# Altium schematic symbol library AD_Lib.SchLib: 1239 symbols (part 5 of 9) (continued)
## J_09 03 264 6825
designator J?, comment 09 03 264 6825
Harting,Female,2*32; Quality: -50~125¡æ; Value: Female,64P; pro-environment: RoHS; SN: 03.4.31.35.11682501S; other: ¹þ¶¡±³°åÁ¬½ÓÆ÷£¬±³°åÓÃ; PadsNum: 0; Manufacturer: Harting; Category: Á¬½ÓÆ÷; OPN: 09 03 264 6825; Part: 09 03 264 6825; QTY: 100; Price: 19.7262; OPN_JLC: OPN_JLC; SN_JLC: SN_JLC; Price_JLC: 0
footprint 09 03 264 6825 (Connector; DIN 41612, Type R, Thru-Hole; Rows a+c, 64 Position; Vertical)
part A pins: a1, a2, a3, a4, a5, a6, a7, a8, a9, a10, a11, a12, a13, a14, a15, a16, a17, a18, a19, a20, a21, a22, a23, a24, a25, a26, a27, a28, a29, a30, a31, a32
part B pins: c1, c2, c3, c4, c5, c6, c7, c8, c9, c10, c11, c12, c13, c14, c15, c16, c17, c18, c19, c20, c21, c22, c23, c24, c25, c26, c27, c28, c29, c30, c31, c32
part C pins: 33 MH1 "Mounting Fixture", 34 MH2 "Mounting Fixture"
part C text: Ä¸; Í·

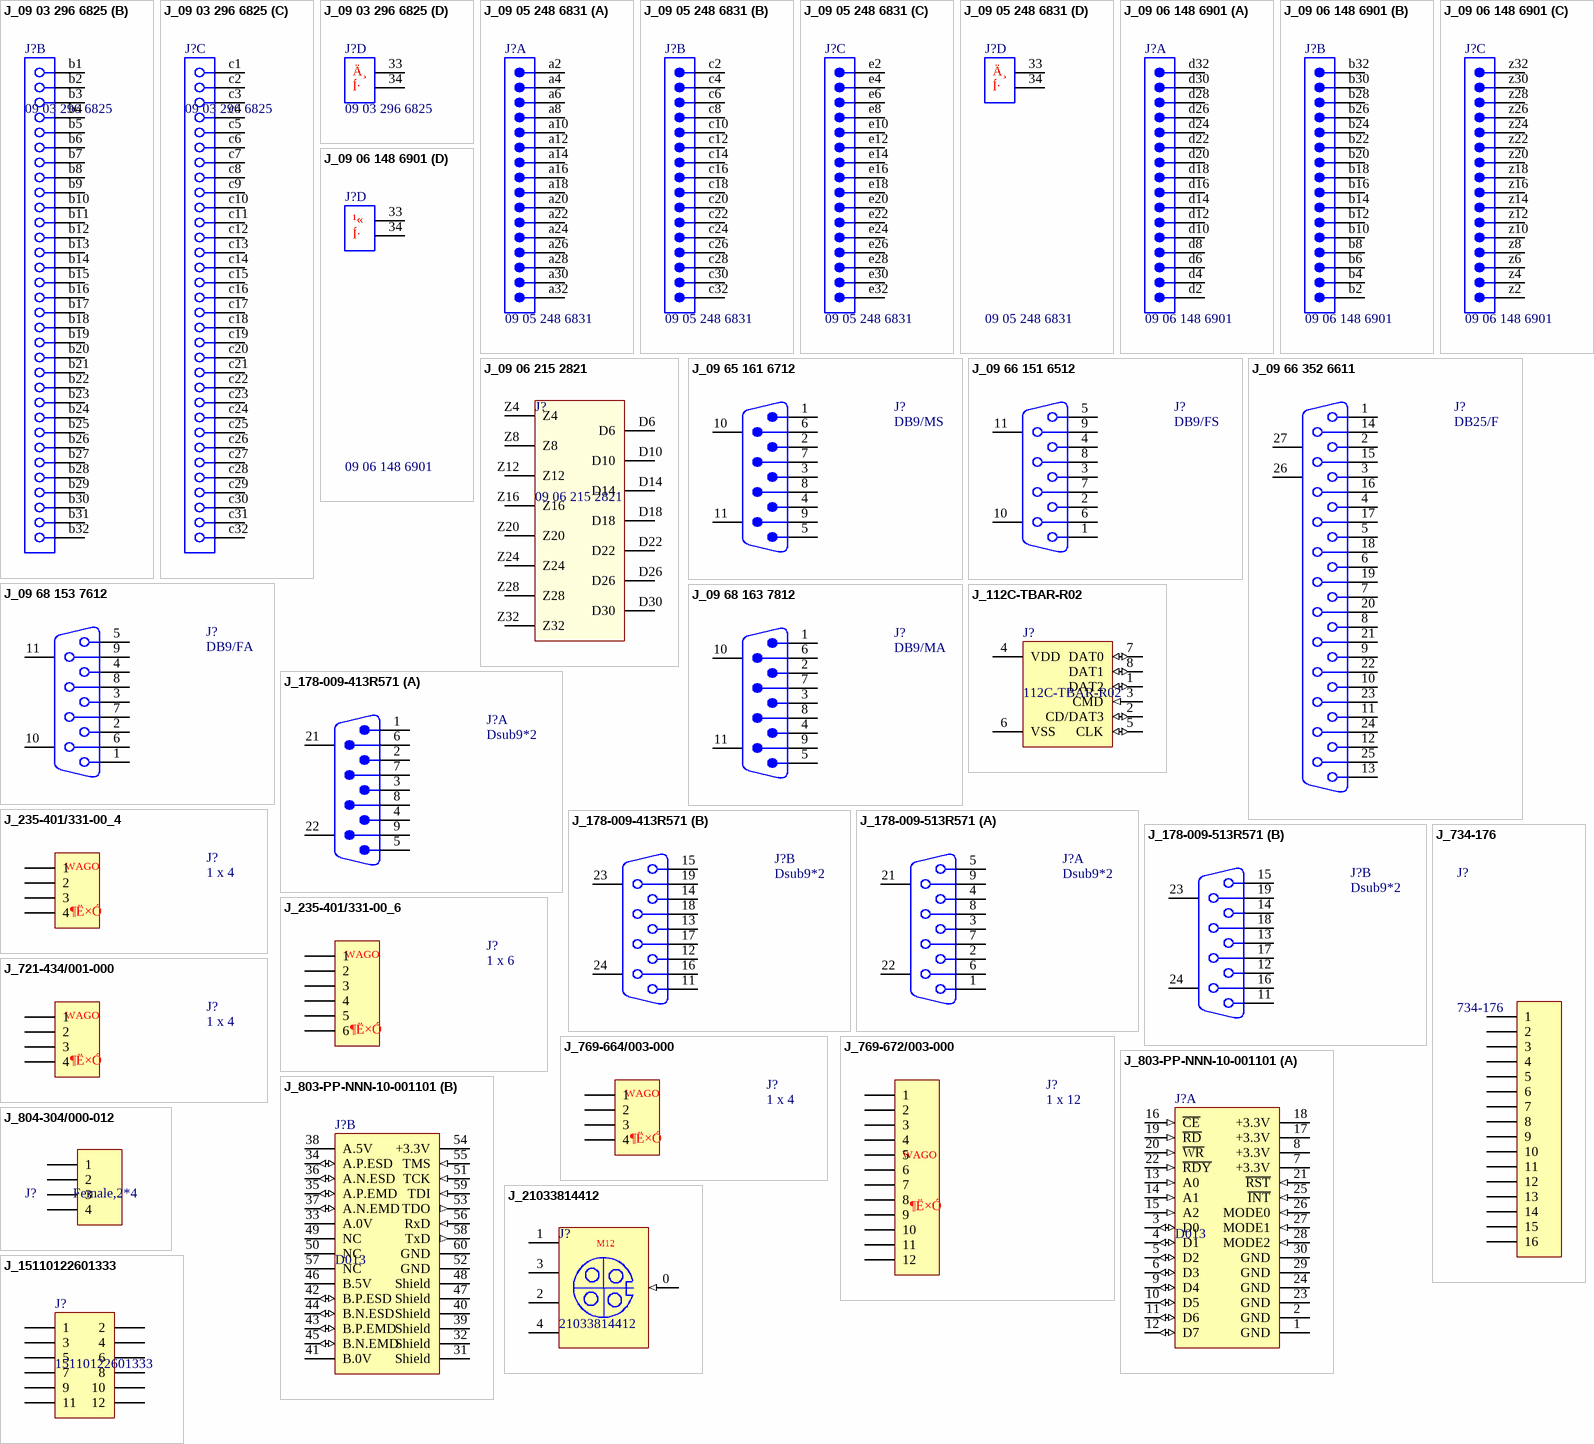
[diagram p22: symbols J_09 03 296 6825 to J_15110122601333]

## J_09 03 296 6825
designator J?, comment 09 03 296 6825
Harting,Female,3*32; Quality: -50~125¡æ; Value: Female,96P; pro-environment: RoHS; SN: 03.4.31.35.99682501S; other: ¹þ¶¡±³°åÁ¬½ÓÆ÷; PadsNum: 0; Manufacturer: Harting; Category: Á¬½ÓÆ÷; OPN: 09 03 296 6825; Part: 09 03 296 6825; QTY: 100; Price: 22.9554; OPN_JLC: OPN_JLC; SN_JLC: SN_JLC; Price_JLC: 0
footprint 09 03 296 6825 (Connector; DIN 41612, Type R, Thru-Hole; Rows a+c, 96 Position; Vertical)
part A pins: a1, a2, a3, a4, a5, a6, a7, a8, a9, a10, a11, a12, a13, a14, a15, a16, a17, a18, a19, a20, a21, a22, a23, a24, a25, a26, a27, a28, a29, a30, a31, a32
part B pins: b1, b2, b3, b4, b5, b6, b7, b8, b9, b10, b11, b12, b13, b14, b15, b16, b17, b18, b19, b20, b21, b22, b23, b24, b25, b26, b27, b28, b29, b30, b31, b32
part C pins: c1, c2, c3, c4, c5, c6, c7, c8, c9, c10, c11, c12, c13, c14, c15, c16, c17, c18, c19, c20, c21, c22, c23, c24, c25, c26, c27, c28, c29, c30, c31, c32
part D pins: 33 MH1 "Mounting Fixture", 34 MH2 "Mounting Fixture"
part D text: Ä¸; Í·

## J_09 05 248 6831
designator J?, comment 09 05 248 6831
Harting; Female; 3*16; other: ¹þ¶¡¶ÔÍâÁ¬½ÓÆ÷£¬µ¥°åÓÃ; Quality: -50~125¡æ; pro-environment: RoHS; Value: Male,48P; PadsNum: 0; Manufacturer: Harting; SN: SN; Category: ½Ó²å¼þ/Á¬½ÓÆ÷; OPN: 09 05 248 6831; Part: 09 05 248 6831; QTY: 20; Price: 75.4049; OPN_JLC: OPN_JLC; SN_JLC: SN_JLC; Price_JLC: 0
footprint J_09 05 248 6831 (¹þ¶¡±³°å½ÓÍ·£¬¹«Ä¸Í·£¬48P)
part A pins: a2, a4, a6, a8, a10, a12, a14, a16, a18, a20, a22, a24, a26, a28, a30, a32
part B pins: c2, c4, c6, c8, c10, c12, c14, c16, c18, c20, c22, c24, c26, c28, c30, c32
part C pins: e2, e4, e6, e8, e10, e12, e14, e16, e18, e20, e22, e24, e26, e28, e30, e32
part D pins: 33 MH1 "Mounting Fixture", 34 MH2 "Mounting Fixture"
part D text: Ä¸; Í·

## J_09 06 148 6901
designator J?, comment 09 06 148 6901
Harting,Male,3*16; other: ¹þ¶¡¶ÔÍâÁ¬½ÓÆ÷£¬µ¥°åÓÃ; Quality: -50~125¡æ; pro-environment: RoHS; SN: 03.4.31.35.99690101S; Value: Male,48P; PadsNum: 0; Manufacturer: Harting; Category: ½Ó²å¼þ/Á¬½ÓÆ÷; OPN: 09 06 148 6901; Part: 09 06 148 6901; QTY: 20; Price: 46.7415; OPN_JLC: OPN_JLC; SN_JLC: SN_JLC; Price_JLC: 0
footprint 09 06 148 6901 (¹þ¶¡¶ÔÍâ½ÓÍ·£¨DBZ£©)
part A pins: d2, d4, d6, d8, d10, d12, d14, d16, d18, d20, d22, d24, d26, d28, d30, d32
part B pins: b2, b4, b6, b8, b10, b12, b14, b16, b18, b20, b22, b24, b26, b28, b30, b32
part C pins: z2, z4, z6, z8, z10, z12, z14, z16, z18, z20, z22, z24, z26, z28, z30, z32
part D pins: 33 MH1 "Mounting Fixture", 34 MH2 "Mounting Fixture"
part D text: ¹«; Í·

## J_09 06 215 2821
designator J?, comment 09 06 215 2821
Harting,Female,7+8; SN: 03.4.31.35.99282101S; Value: 7+8,Female; pro-environment: RoHS; Quality: -55~80¡æ; PadsNum: 0; Category: Á¬½ÓÆ÷; OPN: 09 06 215 2821; Part: 09 06 215 2821; Manufacturer: Harting; QTY: 20; Price: 77.5359; OPN_JLC: OPN_JLC; SN_JLC: SN_JLC; Price_JLC: 0
footprint 09 06 215 2821
pins: D6, D10, D14, D18, D22, D26, D30, Z4, Z8, Z12, Z16, Z20, Z24, Z28, Z32

## J_09 65 161 6712
designator J?, comment DB9/MS
DSub9; Male; Straight; Manufacturer: Harting; Value: DSub9,Male; pro-environment: RoHS; OPN: 09 65 161 6712; Quality: -55~125¡ãC; PadsNum: 0; SN: SN; Category: Á¬½ÓÆ÷; Part: DB9/MS; QTY: 50; Price: 15.561; OPN_JLC: OPN_JLC; SN_JLC: SN_JLC; Price_JLC: 0
footprint J_DB9_MS (Dsub9£¬¹«Í·£¬Ö±Õë)
pins: 1, 2, 3, 4, 5, 6, 7, 8, 9, 10 MH1, 11 MH2

## J_09 66 151 6512
designator J?, comment DB9/FS
DSub9; Female; Straight; Manufacturer: Harting; Value: DSub9,Female; pro-environment: RoHS; OPN: 09 66 151 6512; Quality: -55~125¡ãC; other: ÂÝÖù UNC 09670019941; PadsNum: 0; SN: SN; Category: Á¬½ÓÆ÷; Part: DB9/FS; QTY: 50; Price: 19.7145; OPN_JLC: OPN_JLC; SN_JLC: SN_JLC; Price_JLC: 0
footprint DB9_FS (Dsub9£¬Ä¸Í·£¬Ö±Õë)
pins: 1, 2, 3, 4, 5, 6, 7, 8, 9, 10 MH1, 11 MH2

## J_09 66 352 6611
designator J?, comment DB25/F
DSub25,Female,Straight; Manufacturer: Harting; pro-environment: RoHS; OPN: 09 66 352 6611; Quality: -55~125¡ãC; other: ÂÝÖù UNC 09670019941; PadsNum: 0; Value: DSub25,Female; SN: SN; Category: Á¬½ÓÆ÷; Part: DB25/F; QTY: 100; Price: 48.7188; OPN_JLC: OPN_JLC; SN_JLC: SN_JLC; Price_JLC: 0
footprint DB25_FS (Footprint not found)
pins: 1, 2, 3, 4, 5, 6, 7, 8, 9, 10, 11, 12, 13, 14, 15, 16, 17, 18, 19, 20, 21, 22, 23, 24, 25, 26 MH1, 27 MH2

## J_09 68 153 7612
designator J?, comment DB9/FA
DSub9; Female; Angle; Manufacturer: Harting; Value: DSub9,Female; pro-environment: RoHS; SN: 03.4.31.99.99153701S; OPN: 09 68 153 7612; Quality: -55~125¡ãC; other: ÂÝÖù UNC 09670019941; PadsNum: 0; Category: Á¬½ÓÆ÷; Part: DB9/FA; QTY: 50; Price: 19.7145; OPN_JLC: OPN_JLC; SN_JLC: SN_JLC; Price_JLC: 0
footprint J_DB9_FA (Connector; D Subminiature; 9 Position; Right Angle; Pitch 1.385 mm)
pins: 1, 2, 3, 4, 5, 6, 7, 8, 9, 10 MH1, 11 MH2

## J_09 68 163 7812
designator J?, comment DB9/MA
DSub9; Male; Angle; Manufacturer: Harting; Value: DSub9,Male; pro-environment: RoHS; SN: 03.4.31.99.99163701S; OPN: 09 68 163 7812; Quality: -55~125¡ãC; other: ÂÝÖù UNC 09670019941; PadsNum: 0; Category: Á¬½ÓÆ÷; Part: DB9/MA; QTY: 50; Price: 15.561; OPN_JLC: OPN_JLC; SN_JLC: SN_JLC; Price_JLC: 0
footprint J_DB9_MA (Connector; D Subminiature; 9 Position; Right Angle; Pitch 1.385 mm)
pins: 1, 2, 3, 4, 5, 6, 7, 8, 9, 10 MH1, 11 MH2

## J_112C-TBAR-R02
designator J?, comment 112C-TBAR-R02
MicroSD¿¨²Û; 1*8; 1.1mm; Manufacturer: Attend; Quality: -50~125¡æ; Value: Female,8P; pro-environment: RoHS; other: SD¿¨²Û; PadsNum: 12; SN: SN; Category: Á¬½ÓÆ÷; OPN: 112C-TBAR-R02; Part: 112C-TBAR-R02; QTY: 1000; Price: -; OPN_JLC: DS1139-06-08SS4BSR; SN_JLC: C86574; Price_JLC: 1.0732
footprint J_MicroSD
pins: 1 DAT2 (io), 2 CD/DAT3 (io), 3 CMD (in), 4 VDD (power), 5 CLK (io), 6 VSS (power), 7 DAT0 (io), 8 DAT1 (io)

## J_178-009-413R571
designator J?, comment Dsub9*2
DSub9 * 2; ¹«/Ä¸Í·; ÍäÕë; Manufacturer: NorComp; pro-environment: RoHS; OPN: 178-009-413R571; Quality: -55~125¡ãC; other: ÂÝÖù£¿£¿£¿; PadsNum: 0; Value: DSub9 * 2; SN: SN; Category: Á¬½ÓÆ÷; Part: Dsub9*2; QTY: 45; Price: 48.3188; OPN_JLC: OPN_JLC; SN_JLC: SN_JLC; Price_JLC: 0
footprint J_178-009-413R571 (Dual Port D-SUB plug)
part A pins: 1, 2, 3, 4, 5, 6, 7, 8, 9, 21 MH1, 22 MH2
part B pins: 11, 12, 13, 14, 15, 16, 17, 18, 19, 23 FH, 24 FH2

## J_178-009-513R571
designator J?, comment Dsub9*2
DSub9 * 2; Ä¸/Ä¸Í·; ÍäÕë; Manufacturer: NorComp; pro-environment: RoHS; OPN: 178-009-513R571; Quality: -55~125¡ãC; other: ÂÝÖù£¿£¿£¿; PadsNum: 0; Value: DSub9 * 2; SN: SN; Category: Á¬½ÓÆ÷; Part: Dsub9*2; QTY: 45; Price: 48.3188; OPN_JLC: OPN_JLC; SN_JLC: SN_JLC; Price_JLC: 0
footprint J_178-009-513R571 (Dual Port D-SUB plug upper -socket bottom)
part A pins: 1, 2, 3, 4, 5, 6, 7, 8, 9, 21 MH1, 22 MH2
part B pins: 11, 12, 13, 14, 15, 16, 17, 18, 19, 23 FH, 24 FH2

## J_235-401/331-00_4
designator J?, comment 1 x 4
WAGO½ÓÏß¶Ë×Ó;1*4;10A;300V; Manufacturer: WAGO; pro-environment: RoHS; OPN: 235-401/331-00; Quality: -55~125¡ãC; other: 4¼«;»ÒÉ«; PadsNum: 0; Value: 10A;300V; SN: SN; Category: Á¬½ÓÆ÷; Part: 1 x 4; QTY: 800; Price: ?; OPN_JLC: OPN_JLC; SN_JLC: SN_JLC; Price_JLC: 0
footprint 235-401/331-00_4
pins: 1, 2, 3, 4
text: ¶Ë×Ó

## J_235-401/331-00_6
designator J?, comment 1 x 6
WAGO½ÓÏß¶Ë×Ó£¬1*6; Manufacturer: WAGO; Value: 10A;300V; pro-environment: RoHS; OPN: 235-401/331-00; Quality: -55~125¡ãC; other: 6¼«;»ÒÉ«; PadsNum: 0; SN: SN; Category: Á¬½ÓÆ÷; Part: 1 x 6; QTY: 800; Price: ?; OPN_JLC: OPN_JLC; SN_JLC: SN_JLC; Price_JLC: 0
footprint 235-401/331-00_6 (WAGOÖ®PCB½ÓÏß¶Ë×Ó£¬Æ´½ÓÊ½£¬6¼«)
pins: 1, 2, 3, 4, 5, 6
text: ¶Ë×Ó

## J_721-434/001-000
designator J?, comment 1 x 4
WAGO½ÓÏß¶Ë×Ó;1*4;10A;300V; Manufacturer: WAGO; pro-environment: RoHS; SN: 03.4.31.17.99434001S; OPN: 721-434/001-000; Quality: -55~125¡ãC; other: 4¼«;°×É«; PadsNum: 0; Value: 10A;300V; Category: Á¬½ÓÆ÷; Part: 1 x 4; QTY: 200; Price: ?; OPN_JLC: OPN_JLC; SN_JLC: SN_JLC; Price_JLC: 0
footprint 721-434/001-000_4 (Footprint not found)
pins: 1, 2, 3, 4
text: ¶Ë×Ó

## J_734-176
designator J?, comment 734-176
WAGO¶Ë×Ó;1*16; Manufacturer: WAGO; Part: HDR1*16; other: Òý½Å¼ä¾à2.54mm; Quality: -55~105¡ãC; pro-environment: RoHS; PadsNum: 0; SN: SN; Value: 1*16; Category: Á¬½ÓÆ÷; OPN: 734-176; Price: ?; OPN_JLC: OPN_JLC; SN_JLC: SN_JLC; Price_JLC: 0
footprint 734-176 (Footprint not found)
pins: 1, 2, 3, 4, 5, 6, 7, 8, 9, 10, 11, 12, 13, 14, 15, 16

## J_769-664/003-000
designator J?, comment 1 x 4
WAGO½ÓÏß¶Ë×Ó;1*4;32A;500V; Manufacturer: WAGO; pro-environment: RoHS; OPN: 769-664/003-000; Quality: -55~125¡ãC; other: 4¼«;»ÒÉ«; PadsNum: 0; Value: 32A;500V; SN: SN; Category: Á¬½ÓÆ÷; Part: 1 x 4; QTY: 800; Price: ?; OPN_JLC: OPN_JLC; SN_JLC: SN_JLC; Price_JLC: 0
footprint 769-664/003-000_4 (Footprint not found)
pins: 1, 2, 3, 4
text: ¶Ë×Ó

## J_769-672/003-000
designator J?, comment 1 x 12
WAGO½ÓÏß¶Ë×Ó;1*12;32A;250V; Manufacturer: WAGO; pro-environment: RoHS; OPN: 769-672/003-000; Quality: -55~125¡ãC; other: 12¼«;»ÒÉ«; PadsNum: 0; Value: 32A;250V; SN: SN; Category: Á¬½ÓÆ÷; Part: 1 x 12; QTY: 25; Price: ?; OPN_JLC: OPN_JLC; SN_JLC: SN_JLC; Price_JLC: 0
footprint 769-672/003-000 (Footprint not found)
pins: 1, 2, 3, 4, 5, 6, 7, 8, 9, 10, 11, 12
text: ¶Ë×Ó

## J_803-PP-NNN-10-001101
designator J?, comment D013
MVBÄ£¿é²å×ù; Manufacturer: TRACO; Quality: -40~85¡æ; Value: Female,60Pin; pro-environment: RoHS; other: MVBÄ£¿éD013²å×ù£¬2¸ö2*15Ë«ÅÅÄ¸; OPN: 803-PP-NNN-10-001101; PadsNum: 0; SN: SN; Category: Á¬½ÓÆ÷; Part: D013; QTY: 1; Price: ?; OPN_JLC: OPN_JLC; SN_JLC: SN_JLC; Price_JLC: 0
footprint D013 (MVB²å×ù£¬803-PP-NNN-10-001101)
part A pins: 1 GND (power), 2 GND (power), 3 D0 (io), 4 D1 (io), 5 D2 (io), 6 D3 (io), 7 +3.3V (power), 8 +3.3V (power), 9 D4 (io), 10 D5 (io), 11 D6 (io), 12 D7 (io), 13 A0 (in), 14 A1 (in), 15 A2 (in), 16 ~{CE} (in), 17 +3.3V (power), 18 +3.3V (power), 19 ~{RD} (in), 20 ~{WR} (in), 21 ~{RST} (in), 22 ~{RDY} (in), 23 GND (power), 24 GND (power), 25 ~{INT} (in), 26 MODE0 (in), 27 MODE1 (in), 28 MODE2 (in), 29 GND (power), 30 GND (power)
part B pins: 31 Shield (power), 32 Shield (power), 33 A.0V (power), 34 A.P.ESD (io), 35 A.P.EMD (io), 36 A.N.ESD (io), 37 A.N.EMD (io), 38 A.5V (power), 39 Shield (power), 40 Shield (power), 41 B.0V (power), 42 B.P.ESD (io), 43 B.P.EMD (io), 44 B.N.ESD (io), 45 B.N.EMD (io), 46 B.5V (power), 47 Shield (power), 48 Shield (power), 49 NC (power), 50 NC (power), 51 TCK (in), 52 GND (power), 53 TDO (out), 54 +3.3V (power), 55 TMS (in), 56 RxD (in), 57 NC (power), 58 TxD (out), 59 TDI (in), 60 GND (power)

## J_804-304/000-012
designator J?, comment Female,2*4
Á¬½ÓÆ÷£¬Ä¸Í·£¬2*4; manufacturer: WAGO; Quality: -40~85¡æ; OPN: 804-304/000-012; Pro-environment: RoHS; PadsNum: 0; Value: Female,2*4; Category: Á¬½ÓÆ÷; SN: SN; Price: ?; OPN_JLC: OPN_JLC; SN_JLC: SN_JLC; Price_JLC: 0
footprint 804-304/000-012
pins: 1, 2, 3, 4

## J_21033814412
designator J?, comment 21033814412
M12Á¬½ÓÆ÷; Manufacturer: Harting; SN: 03.4.31.18.99441201S; pro-environment: RoHS; Quality: -55~80¡æ; PadsNum: 0; Category: Á¬½ÓÆ÷; OPN: 21033814412; Part: 21033814412; Value: -; QTY: 10; Price: ?; OPN_JLC: OPN_JLC; SN_JLC: SN_JLC; Price_JLC: 0
footprint 21033814412 (M12Á¬½ÓÆ÷)
pins: 0 Sheld (in), 1, 2, 3, 4
text: M12

## J_15110122601333
designator J?, comment 15110122601333
Harting,Male,2*6; Quality: -50~125¡æ; Value: Male,12P; pro-environment: RoHS; SN: 03.4.31.35.99151101S; other: °å¶Ô°åÓë¼Ð²ãÁ¬½ÓÆ÷; PadsNum: 0; Manufacturer: Harting; Category: Á¬½ÓÆ÷; OPN: 15110122601333; Part: 15110122601333; QTY: 2; Price: ?; OPN_JLC: OPN_JLC; SN_JLC: SN_JLC; Price_JLC: 0
footprint 15110122601 (Har_flex_M/F_straight_12Pin)
pins: 1, 2, 3, 4, 5, 6, 7, 8, 9, 10, 11, 12

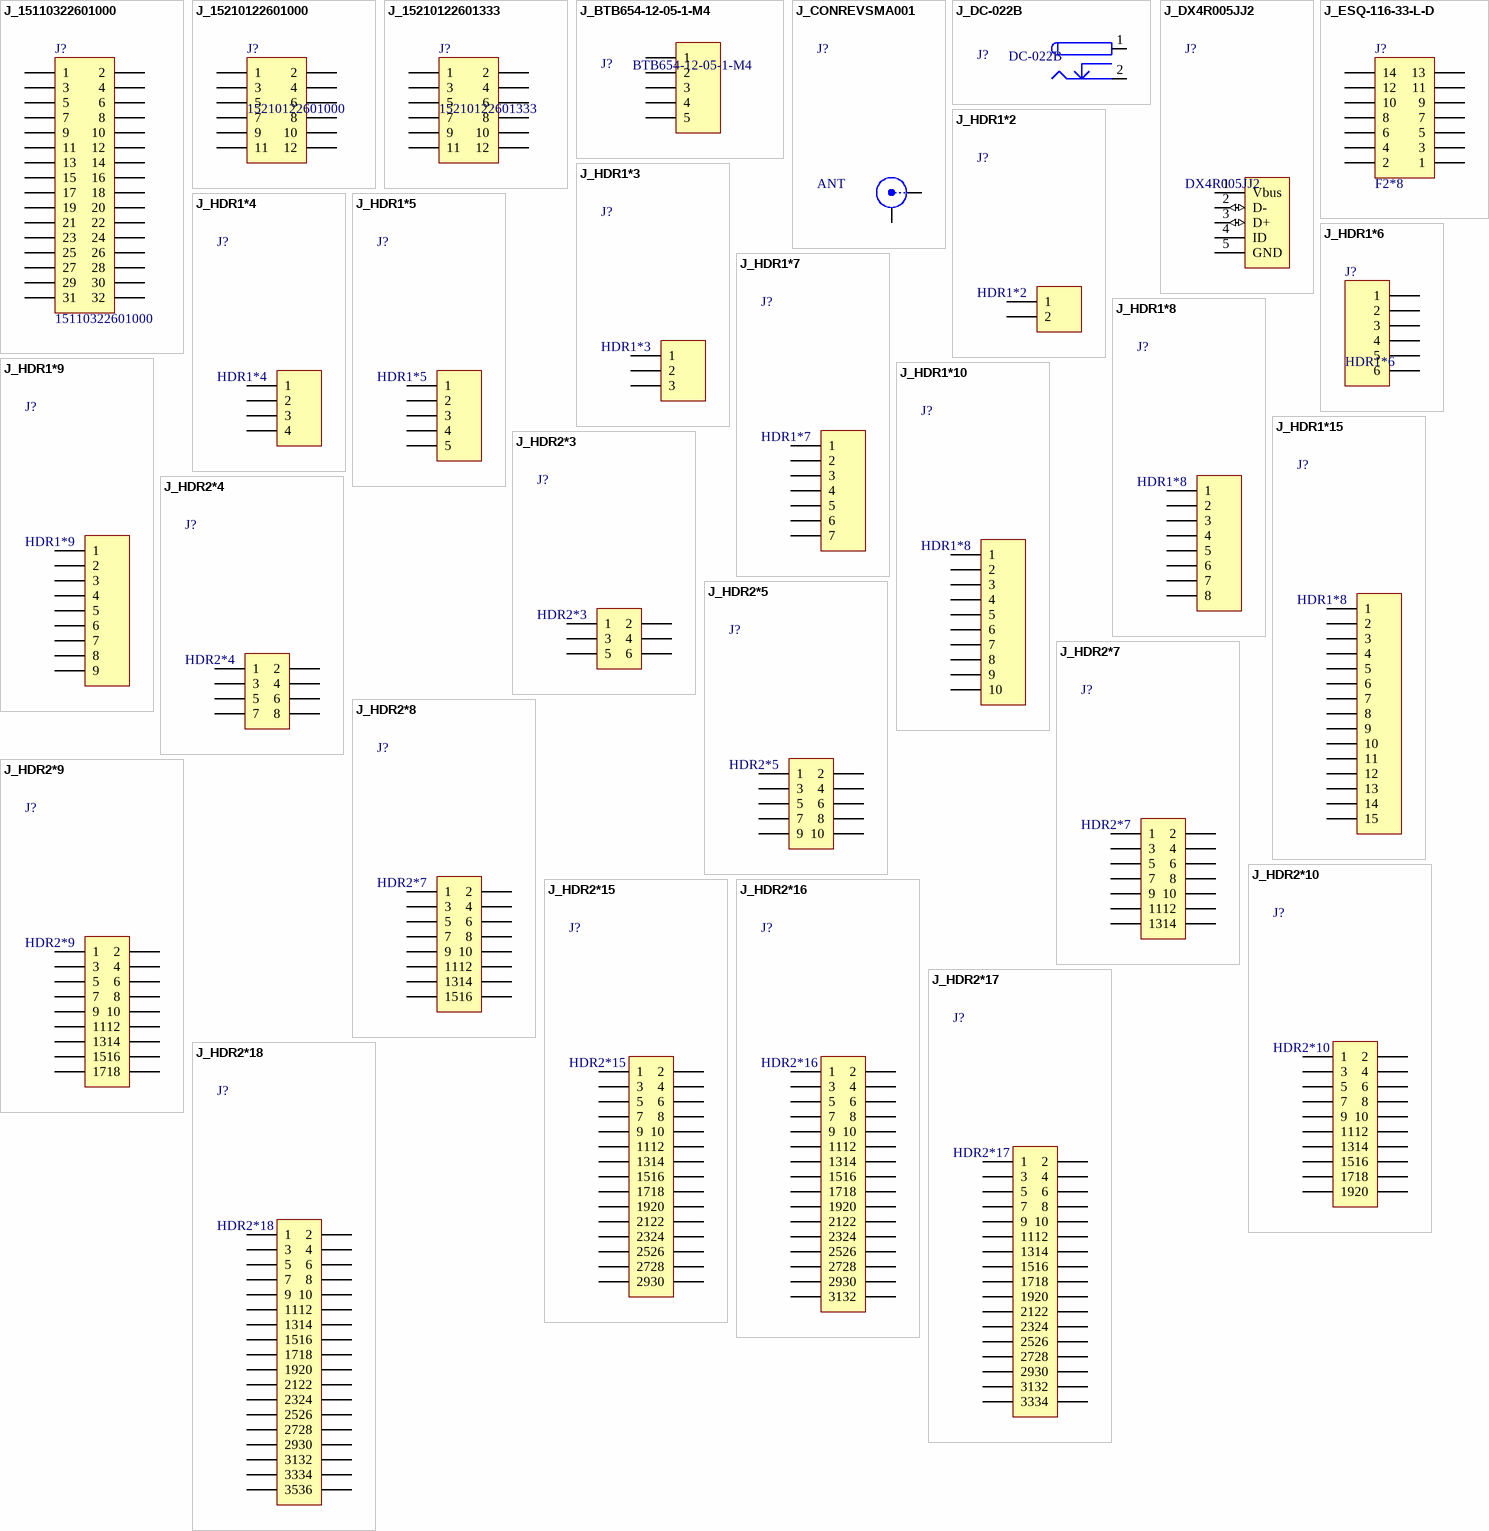
[diagram p23: symbols J_15110322601000 to J_HDR2*18]

## J_15110322601000
designator J?, comment 15110322601000
Harting,Male,2*16; pro-environment: RoHS; Quality: -55~80¡æ; SN: 03.4.31.13.99151101S; Value: Male;16*2; PadsNum: 0; Manufacturer: Harting; Category: Á¬½ÓÆ÷; OPN: 15110322601000; Part: 15110322601000; QTY: 280; Price: 27.1089; OPN_JLC: OPN_JLC; SN_JLC: SN_JLC; Price_JLC: 0
footprint 15110322601000 (Male)
pins: 1, 2, 3, 4, 5, 6, 7, 8, 9, 10, 11, 12, 13, 14, 15, 16, 17, 18, 19, 20, 21, 22, 23, 24, 25, 26, 27, 28, 29, 30, 31, 32

## J_15210122601000
designator J?, comment 15210122601000
Harting,Male,2*6; Quality: -50~125¡æ; Value: Male,12P; pro-environment: RoHS; SN: 03.4.31.35.99151101S; other: °å¶Ô°åÓë¼Ð²ãÁ¬½ÓÆ÷; PadsNum: 0; Manufacturer: Harting; Category: Á¬½ÓÆ÷; OPN: 15210122601000; Part: 15210122601000; QTY: 280; Price: 18.3573; OPN_JLC: OPN_JLC; SN_JLC: SN_JLC; Price_JLC: 0
footprint 15210122601 (Har_flex_M/F_straight_12Pin)
pins: 1, 2, 3, 4, 5, 6, 7, 8, 9, 10, 11, 12

## J_15210122601333
designator J?, comment 15210122601333
Harting,Female,2*6; Quality: -50~125¡æ; Value: Female,12P; pro-environment: RoHS; SN: 03.4.31.35.99152101S; other: °å¶Ô°åÓë¼Ð²ãÁ¬½ÓÆ÷; PadsNum: 0; Manufacturer: Harting; Category: Á¬½ÓÆ÷; OPN: 15210122601333; Part: 15210122601333; QTY: 2; Price: ?; OPN_JLC: OPN_JLC; SN_JLC: SN_JLC; Price_JLC: 0
footprint 15210122601 (Har_flex_M/F_straight_12Pin)
pins: 1, 2, 3, 4, 5, 6, 7, 8, 9, 10, 11, 12

## J_BTB654-12-05-1-M4
designator J?, comment BTB654-12-05-1-M4
½ÓÏß¶Ë×Ó£¬1*5; manufacturer: ½ÜÌØ; SN: 03.4.31.16.99BTB601S; Pro-environment: RoHS; PadsNum: 0; Category: Á¬½ÓÆ÷; OPN: BTB654-12-05-1-M4; Price: ?; OPN_JLC: OPN_JLC; SN_JLC: SN_JLC; Price_JLC: 0
footprint BTB654-12-05-1-M4
pins: 1, 2, 3, 4, 5

## J_CONREVSMA001
designator J?, comment ANT
SMA; Female; SMAKE Õý½ÅÁ¢Ê½; Manufacturer: Linx; Quality: -55~105¡ãC; pro-environment: RoHS; Value: ANT, Female; OPN: CONREVSMA001; PadsNum: 0; other: SMA; SN: SN; Category: Á¬½ÓÆ÷; Part: ANT; QTY: 100; Price: 17.667; OPN_JLC: OPN_JLC; SN_JLC: SN_JLC; Price_JLC: 0
footprint SMAKE_Vertical (SMAKEÕý½Å£¬Á¢Ê½)
pins: 1 X, 2 Y

## J_DC-022B
designator J?, comment DC-022B
µÍÑ¹Ö±Á÷µçÔ´²å×ù; manufacturer: ÉîÛÚÌØ¼ÓÌØ; Pro-environment: RoHS; PadsNum: 0; SN: SN; Category: Á¬½ÓÆ÷; OPN: DC-022B; Price: ?; OPN_JLC: OPN_JLC; SN_JLC: SN_JLC; Price_JLC: 0
footprint DC-022B_5.5*2.1 (Footprint not found)
pins: 1 (power), 2 (power)

## J_DX4R005JJ2
designator J?, comment DX4R005JJ2
USB; Micro_B; Female; Manufacturer: JAE; Quality: -30~80¡ãC; pro-environment: RoHS; Value: USB,Micro_B; PadsNum: 0; other: USB; Micro_B; Female; SN: SN; Category: Á¬½ÓÆ÷; OPN: DX4R005JJ2; Part: DX4R005JJ2; QTY: 1800; Price: 3.1239; OPN_JLC: OPN_JLC; SN_JLC: SN_JLC; Price_JLC: 0
footprint USB_Micro-B (USB connector; Micro-B Receptacle; SMT)
pins: 1 Vbus (power), 2 D- (io), 3 D+ (io), 4 ID, 5 GND (power)
